# Altium footprint library XTIDA-010086.PcbLib: 88 footprints (part 4 of 6)
Each footprint in its own frame and in the unit in brackets; x right, y up, seen from the top. Pads: shape width x height; smd on the part's side, far side on the other; paste and mask are expansions set on the pad; w line width, h text height; cw(c..) or ccw(c..) is an arc to the next point about the centre after c.
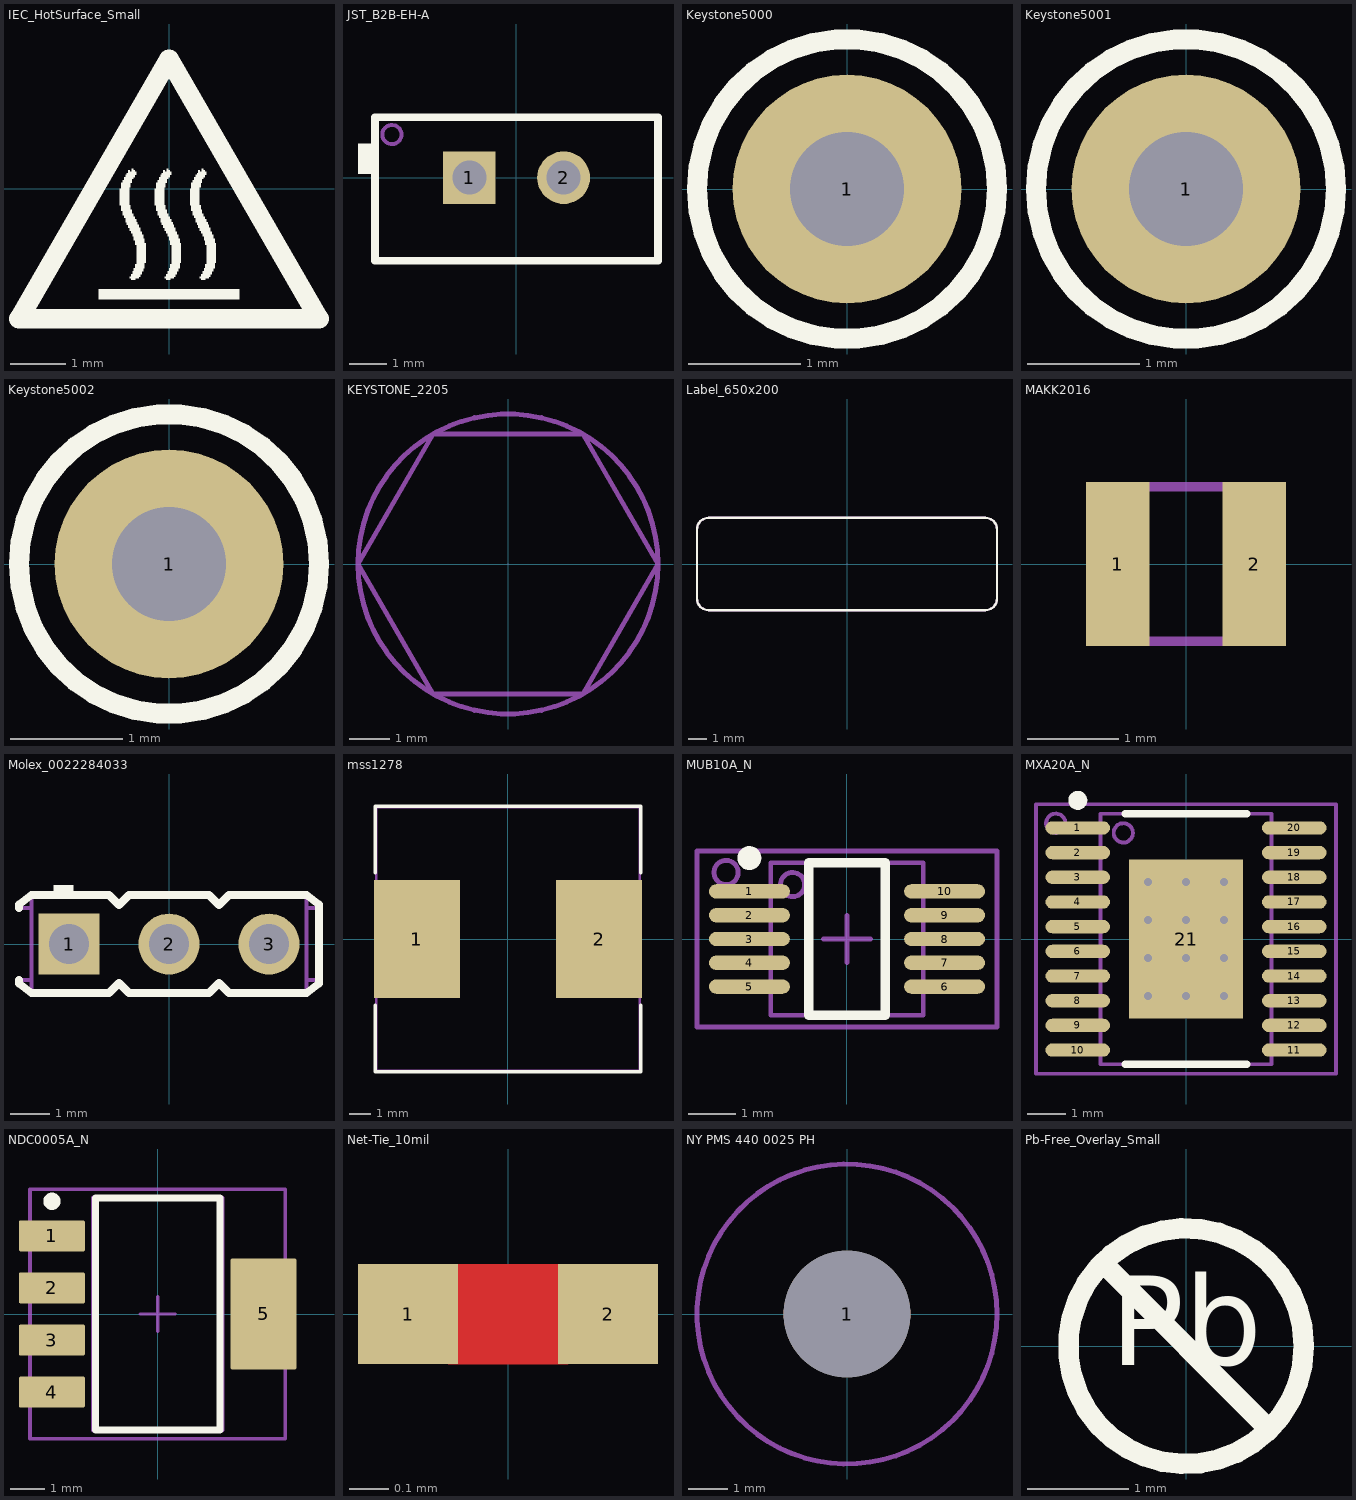
[diagram p3: the footprints below, top view; thin cyan lines are the x and y axes]

## IEC_HotSurface_Small [mm]
height 19.05
Top Overlay:
  drawing of 10 lines, arcs and shapes, not listed

## JST_B2B-EH-A [mm] "Header (Shrouded), 2.5mm, 2x1, TH"
height 6
pads (2):
  rect 1.4x1.4 hole 0.9: 1(-1.25,0)
  round 1.4 hole 0.9: 2(1.25,0)
Top Overlay:
  rectangle: -4.2,0.1 -3.8,0.9
  lines w0.2: -3.75,-2.2 -3.75,-0.602 -3.75,1.6 3.75,1.6 3.75,-0.2 3.75,-0.602 3.75,-2.2 2.7,-2.2 -2.7,-2.2 -3.75,-2.2
Mechanical 5:
  circle w0.102: c-3.302,1.143 r0.254
  lines w0.1: -3.75,-2.2 -2.7,-2.2 2.7,-2.2 3.75,-2.2 3.75,-0.602 3.75,-0.2 3.75,1.6 -3.75,1.6 -3.75,-0.2 -3.75,-0.602 -3.75,-2.2
  text ".Designator" at -3.749,-0.25 h0.75
Mechanical 13:
  circle w0.102: c-3.302,1.143 r0.254
3D body "B2B-EH-A.stp": height 6, standoff -3.2, extent -3.75,-2.2 3.75,1.6

## Keystone5000 [mil] "For Keystone 500x miniature loop terminals"
height 181.1
pads (1):
  round 80 hole 40: 1(0,0)
Top Overlay:
  circle w7: c0,0 r52.5
Mechanical 5:
  circle w3.94: c0,0 r52.5
  text ".Designator" at -88.55,-5.9 h17.72
3D body "Keystone_5000.stp": height 181.97, standoff -118.11, extent -49,-49 49.04,49.24

## Keystone5001 [mil] "For Keystone 500x miniature loop terminals"
height 181.1
pads (1):
  round 80 hole 40: 1(0,0)
Top Overlay:
  circle w7: c0,0 r52.5
Mechanical 5:
  circle w3.94: c0,0 r52.5
  text ".Designator" at -88.55,-5.9 h17.72
3D body "Keystone_5001.stp": height 181.97, standoff -118.11, extent -49,-49 49.04,49.24

## Keystone5002 [mil] "For Keystone 500x miniature loop terminals"
height 181.1
pads (1):
  round 80 hole 40: 1(0,0)
Top Overlay:
  circle w7: c0,0 r52.5
Mechanical 5:
  circle w3.94: c0,0 r52.5
  text ".Designator" at -88.98,-5.44 h17.72
3D body "Keystone_5002.stp": height 181.97, standoff -118.11, extent -49,-49 49.04,49.23

## KEYSTONE_2205 [mil] "THREAD HEX ALUMINUM STANDOFF 4-40, F-F 1\""
height 1000
pads (1):
  round 1 on Mech3: 0(0,0)
Mechanical 5:
  circle w5: c0,0 r147.76
  lines w5: -147.75,-0.05 -73.87,-128 73.87,-128 147.75,-0.05 73.87,127.91 -73.87,127.91 -147.75,-0.05
  text ".Designator" at -148.02,-9.38 h29.53
3D body "Keystone_2205.stp": height 1000.6, standoff 0.6, extent -147.74,-127.95 147.75,127.96

## Label_650x200 [mil] "Thermal Transfer Label"
height 1
pads (1):
  round 1 on Mech13: 0(0,0)
Top Overlay:
  lines w5: -325,-75 ccw(c-300,-75) -300,-100 300,-100 ccw(c300,-75) 325,-75 325,75 ccw(c300,75) 300,100 -300,100 ccw(c-300,75) -325,75 -325,-75
Mechanical 5:
  lines w5: -325,-75 ccw(c-300,-75) -300,-100 300,-100 ccw(c300,-75) 325,-75 325,75 ccw(c300,75) 300,100 -300,100 ccw(c-300,75) -325,75 -325,-75
  text ".Designator" at 2.37,25.65 h18
3D body: height 1, standoff 0, extent -325.02,-100.02 325.02,100.02

## MAKK2016 [mm] "Taiyo Yuden"
height 1
pads (2):
  rect 0.7x1.8 smd: 1(-0.75,0) 2(0.75,0)
Mechanical 5:
  lines w0.1: -1.05,-0.85 1.05,-0.85 1.05,0.85 -1.05,0.85 -1.05,-0.85
  text ".Designator" at -2.249,-0.15 h0.45
3D body: height 0.5, standoff 0, extent 0.55,-0.85 1.05,0.85
3D body: height 0.5, standoff 0, extent -1.05,-0.85 -0.55,0.85
3D body: height 0.5, standoff 0, extent -0.551,-0.851 0.551,0.851
3D body: height 1, standoff 0.5, extent -1.05,-0.85 1.05,0.85

## Molex_0022284033 [mm] "Header, 2.54mm, 3x1, TH"
height 8.88
pads (3):
  rect 1.55x1.55 hole 1.02: 1(-2.54,0)
  round 1.55 hole 1.02: 2(0,0) 3(2.54,0)
Top Overlay:
  rectangle: -2.93,1.245 -2.43,1.5
  lines w0.2: -3.81,-0.914 -3.81,-1.003 -3.492,-1.245 -1.524,-1.245 -1.27,-0.991 -1.016,-1.245 1.016,-1.245 1.27,-0.991 1.524,-1.245 3.492,-1.245 3.81,-1.003 3.81,-0.914 3.81,0.914 3.81,1.003 3.492,1.245 1.524,1.245 1.27,0.991 1.016,1.245 -1.016,1.245 -1.27,0.991 -1.524,1.245 -3.492,1.245 -3.81,1.003 -3.81,0.914
Mechanical 5:
  lines w0.1: -3.492,-1.168 -3.492,1.168 ; -3.492,-0.914 -3.81,-0.914 -3.81,-1.003 -3.492,-1.245 -1.524,-1.245 -1.27,-0.991 -1.016,-1.245 1.016,-1.245 1.27,-0.991 1.524,-1.245 3.492,-1.245 3.81,-1.003 3.81,-0.914 ; -3.492,0.914 -3.81,0.914 -3.81,1.003 -3.492,1.245 -1.524,1.245 -1.27,0.991 -1.016,1.245 1.016,1.245 1.27,0.991 1.524,1.245 3.492,1.245 3.81,1.003 3.81,0.914 ; 3.492,-1.168 3.492,1.168 ; 3.492,-0.914 3.81,-0.914 ; 3.492,0.914 3.81,0.914 ; 3.81,-0.914 3.81,0.914
  text ".Designator" at -3.749,-0.25 h0.75
3D body "022284033.stp": height 8.4, standoff -3.16, extent -3.81,-1.244 3.81,1.245

## mss1278 [mm] "Coilcraft recommended land pattern.  Document 598-2 rev 04/04/13"
height 8.05
pads (2):
  rect 4x5.5 smd: 1(-4.25,0) 2(4.25,0)
Top Overlay:
  lines w0.17: -6.2,-3.1 -6.2,-6.2 6.2,-6.2 6.2,-3.1 ; -6.2,3.1 -6.2,6.2 6.2,6.2 6.2,3.1
Mechanical 5:
  lines w0.1: -6.15,-6.15 -6.15,6.15 6.15,6.15 6.15,-6.15 -6.15,-6.15
  text ".Designator" at -5.009,-0.321 h1
3D body: height 8.05, standoff 0, extent -6.149,-6.149 6.149,6.149

## MUB10A_N [mm] "TSSOP, 10-Leads, Body 3x3mm, Pitch 0.5mm, IPC Medium Density"
height 1.09
pads (10):
  oval 1.7x0.3 smd: 1(-2.05,1) 2(-2.05,0.5) 3(-2.05,0) 4(-2.05,-0.5) 5(-2.05,-1) 6(2.05,-1) 7(2.05,-0.5) 8(2.05,0) 9(2.05,0.5) 10(2.05,1)
Top Overlay:
  circle w0.25: c-2.05,1.7 r0.125
  lines w0.2: -0.8,-1.6 -0.8,1.6 0.8,1.6 0.8,-1.6 -0.8,-1.6
Mechanical 5:
  circle w0.102: c-2.54,1.397 r0.254
  lines w0.1: -3.15,-1.85 3.15,-1.85 3.15,1.85 -3.15,1.85 -3.15,-1.85
  text ".Designator" at -2.26,-0.138 h0.45
Mechanical 13:
  circle w0.102: c-1.143,1.143 r0.254
  lines w0.1: -1.6,-1.6 -1.6,1.6 1.6,1.6 1.6,-1.6 -1.6,-1.6
Mechanical 15:
  lines w0.1: -0.5,0 0.5,0 ; 0,-0.5 0,0.5
3D body: height 1.09, standoff 0, extent -1.6,-1.6 1.6,1.6

## MXA20A_N [mm] "TSOP, 20-Leads, Body 6.5x4.4mm, Pitch 0.65mm, Exposed Pad, IPC Medium Density"
height 1.1
pads (21):
  oval 1.7x0.35 smd: 1(-2.85,2.925) 2(-2.85,2.275) 3(-2.85,1.625) 4(-2.85,0.975) 5(-2.85,0.325) 6(-2.85,-0.325) 7(-2.85,-0.975) 8(-2.85,-1.625) 9(-2.85,-2.275) 10(-2.85,-2.925) 11(2.85,-2.925) 12(2.85,-2.275) 13(2.85,-1.625) 14(2.85,-0.975) 15(2.85,-0.325) 16(2.85,0.325) 17(2.85,0.975) 18(2.85,1.625) 19(2.85,2.275) 20(2.85,2.925)
  rect 3x4.2 smd: 21(0,0)
via 0,1.5 diameter 0.5 hole 0.2
via 1,1.5 diameter 0.5 hole 0.2
via -1,1.5 diameter 0.5 hole 0.2
via -1,0.5 diameter 0.5 hole 0.2
via -1,-0.5 diameter 0.5 hole 0.2
via -1,-1.5 diameter 0.5 hole 0.2
via 1,-1.5 diameter 0.5 hole 0.2
via 0,-1.5 diameter 0.5 hole 0.2
via 1,-0.5 diameter 0.5 hole 0.2
via 0,-0.5 diameter 0.5 hole 0.2
via 1,0.5 diameter 0.5 hole 0.2
via 0,0.5 diameter 0.5 hole 0.2
Top Overlay:
  circle w0.25: c-2.85,3.65 r0.125
  lines w0.2: -1.6,-3.3 1.6,-3.3 ; -1.6,3.3 1.6,3.3
Mechanical 5:
  circle w0.102: c-3.429,3.048 r0.254
  lines w0.1: -3.95,-3.55 3.95,-3.55 3.95,3.55 -3.95,3.55 -3.95,-3.55
  text ".Designator" at -0.238,3.76 h0.75
Mechanical 13:
  circle w0.102: c-1.651,2.794 r0.254
  lines w0.1: -2.25,-3.3 -2.25,3.3 2.25,3.3 2.25,-3.3 -2.25,-3.3
Mechanical 15:
  lines w0.1: -0.5,0 0.5,0 ; 0,-0.5 0,0.5
3D body: height 1.1, standoff 0, extent -2.25,-3.3 2.25,3.3

## NDC0005A_N [mm] "SOT223, 5-Leads, Body 6.7x3.71mm, Pitch 1.5mm, IPC Medium Density"
height 1.8
pads (5):
  rrect11% 1.9x0.9 smd: 1(-3.05,2.25) 2(-3.05,0.75) 3(-3.05,-0.75) 4(-3.05,-2.25)
  rrect5% 1.9x3.2 smd: 5(3.05,0)
Top Overlay:
  circle w0.25: c-3.05,3.25 r0.125
  lines w0.2: -1.8,-3.35 -1.8,3.35 1.8,3.35 1.8,-3.35 -1.8,-3.35
Mechanical 5:
  lines w0.102: -3.683,-3.6 -3.683,3.6 3.683,3.6 3.683,-3.6 -3.683,-3.6
  text ".Designator" at -0.238,3.76 h0.75
Mechanical 13:
  lines w0.127: -1.855,-3.35 1.855,-3.35 1.855,3.35 -1.855,3.35 -1.855,-3.35
Mechanical 15:
  lines w0.1: -0.5,0 0.5,0 ; 0,-0.5 0,0.5
3D body "NDC0005A.stp": height 1.7, standoff 0.02, extent -3.482,-3.25 3.482,3.25

## Net-Tie_10mil [mil] "10mil net tie, no solder mask opening, no solder paste"
height 68.9
pads (2):
  rect 10x10 smd paste-5 mask-5: 1(-10,0) 2(10,0)
Top Layer:
  region: -6,5 6,5 6,-5 -6,-5

## NY PMS 440 0025 PH [mm] "4-40 nylon screw and mounting hole"
height 1.905
pads (1):
  round 3.2 hole 3.2 unplated mask+0.178: 1(0,0)
Mechanical 5:
  circle w0.127: c0,0 r3.789
  text ".Designator" at -5.009,-0.321 h1
3D body "B_F_NY PMS 440 0025 PH.stp": height 2.69, standoff -8.74, extent -3.302,-3.3 3.296,3.3

## Pb-Free_Overlay_Small [mm]
height 19.05
Top Overlay:
  circle w0.203: c0,0 r1.168
  lines w0.203: -0.826,0.826 0.826,-0.826
  text "Pb" at -0.752,-0.48 h1.52